# Altium footprint library Miscellaneous Connectors.PcbLib: 249 footprints (part 16 of 16)
Each footprint in its own frame and in the unit in brackets; x right, y up, seen from the top. Pads: shape width x height; smd on the part's side, far side on the other; paste and mask are expansions set on the pad; w line width, h text height; cw(c..) or ccw(c..) is an arc to the next point about the centre after c.
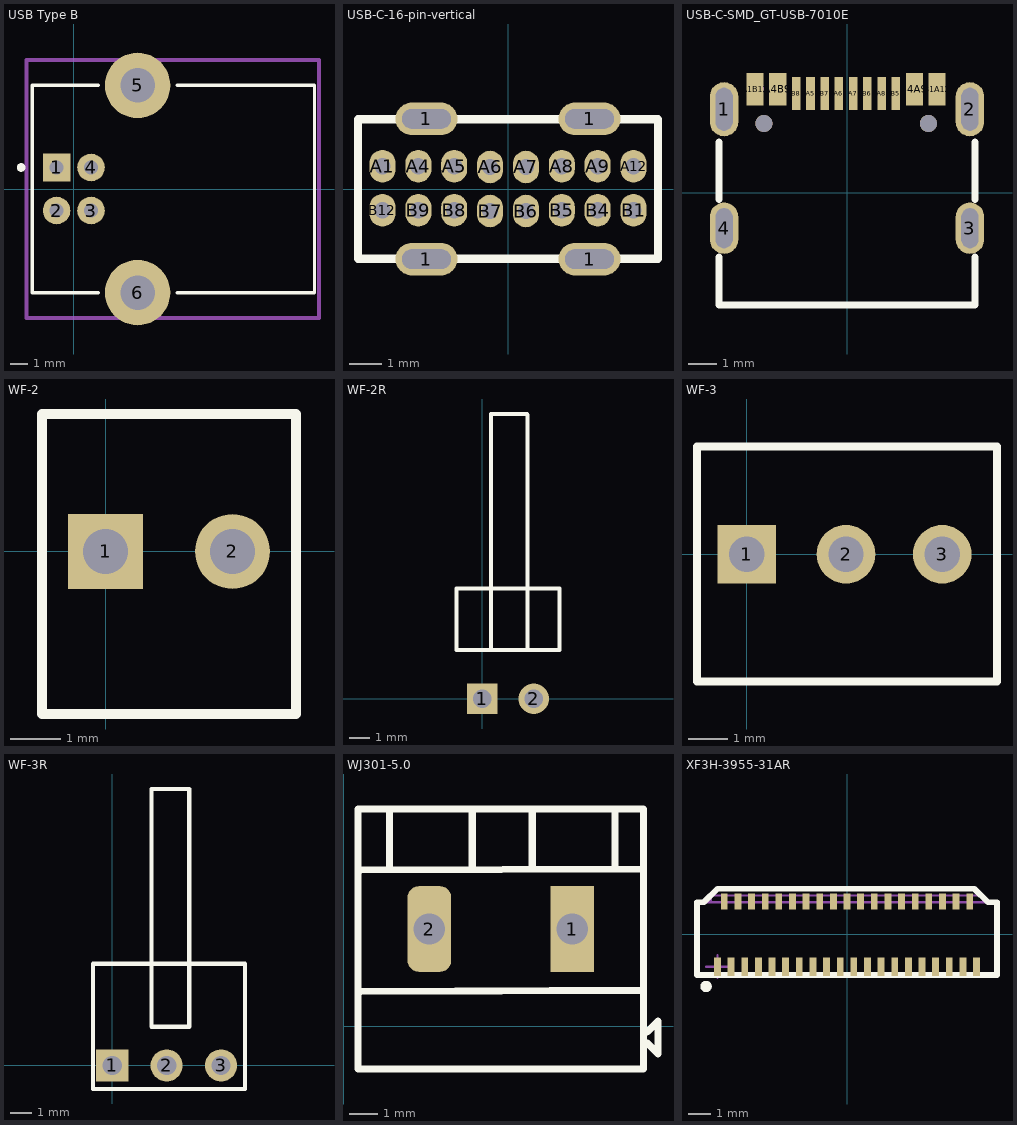
[diagram p15: the footprints below, top view; thin cyan lines are the x and y axes]

## USB Type B [mm] "Connector; USB1.1, Type B, Thru-Hole; 4 Position; Right Angle"
height 11.1
pads (6):
  rect 1.6x1.6 hole 0.8: 1(-1,1.25)
  round 1.6 hole 0.8: 2(-1,-1.25) 3(1,-1.25) 4(1,1.25)
  round 3.8 hole 2: 5(3.71,6.02) 6(3.71,-6.02)
Top Overlay:
  circle w0.25: c-3.06,1.25 r0.125
  lines w0.2: 1.41,-6.02 -2.41,-6.02 -2.41,6.02 1.41,6.02 ; 6.01,-6.02 13.99,-6.02 13.99,6.02 6.01,6.02
Mechanical 15:
  lines w0.254: -2.75,-7.5 -2.75,7.5 14.25,7.5 14.25,-7.5 -2.75,-7.5
3D body "User Library-Samtec - USB-B-S-X-W-TH.STEP": height 11, standoff -3.64, extent -2.55,-7.4 13.95,7.398

## USB-C-16-pin-vertical [mm]
pads (20):
  oval 1.9x1 hole 0.6 slot 1.5 at 0 deg paste+0 mask+0.05: 1(-2.5,-2.15) 1(-2.5,2.15) 1(2.5,-2.15) 1(2.5,2.15)
  oval 0.8x1 hole 0.5: A1(-3.85,0.7) A4(-2.75,0.7) A5(-1.65,0.7) A6(-0.55,0.675) A7(0.55,0.675) A8(1.65,0.7) A9(2.75,0.7) A12(3.85,0.7) B1(3.85,-0.65) B4(2.75,-0.65) B5(1.65,-0.65) B6(0.55,-0.675) B7(-0.55,-0.675) B8(-1.65,-0.65) B9(-2.75,-0.65) B12(-3.85,-0.65)
Top Overlay:
  lines w0.254: 4.6,2.1 4.6,-2.139 -4.6,-2.139 -4.6,2.139 4.6,2.139
3D body "XB-USB-C-1403.stp": height 10, standoff -2.12, extent -4.584,-2.231 4.762,2.371

## USB-C-SMD_GT-USB-7010E [mm]
pads (18):
  oval 1x1.9 hole 0.6 slot 1.5 at 90 deg paste+0 mask+0.05: 1(-4.32,2.941) 2(4.32,2.941)
  oval 1x1.8 hole 0.6 slot 1.4 at 90 deg paste+0 mask+0.05: 3(4.32,-1.239) 4(-4.32,-1.239)
  rect 0.6x1.15 smd paste-100 mask+0.05: A1B12(-3.232,3.641) A4B9(-2.432,3.641) B1A12(3.168,3.641) B4A9(2.368,3.641)
  rect 0.3x1.15 smd paste-100 mask+0.05: A5(-1.282,3.491) A6(-0.282,3.491) A7(0.218,3.491) A8(1.218,3.491) B5(1.718,3.491) B6(0.718,3.491) B7(-0.782,3.491) B8(-1.782,3.491)
  round 0.6 hole 0.6 unplated paste+0: ""(-2.922,2.441) ""(2.858,2.441)
Top Overlay:
  lines w0.254: -4.5,-2.248 -4.5,-3.939 4.5,-3.939 4.5,-2.248 ; -4.5,-0.23 -4.5,1.782 ; 4.5,-0.23 4.5,1.782
Top Paste:
  drawing of 16 lines, arcs and shapes, not listed
Mechanical 15:
  circle w0.254: c-3.175,3.666 r0.127
  circle w0.254: c-2.922,2.441 r0.125
  circle w0.254: c2.858,2.441 r0.125
3D body "2671767.stp": height 3.36, standoff -1, extent -4.47,-3.9 4.47,3.7

## WF-2 [mm] "Connector; Header; 2 Position"
pads (2):
  rect 1.5x1.5 hole 0.9: 1(0,0)
  round 1.5 hole 0.9: 2(2.54,0)
Top Overlay:
  lines w0.2: -1.27,-3.25 -1.27,2.75 3.81,2.75 3.81,-3.25 -1.27,-3.25
3D body "User Library-WF-2.STEP": height 11.73, standoff -2.55, extent -1.35,-3.25 3.85,2.65

## WF-2R [mm] "Connector; Header; 2 Position"
pads (2):
  rect 1.5x1.5 hole 0.9: 1(0,0)
  round 1.5 hole 0.9: 2(2.54,0)
Top Overlay:
  lines w0.2: -1.27,5.4 -1.27,2.4 3.81,2.4 3.81,5.4 ; -1.27,5.45 3.81,5.45 ; 0.43,2.5 0.43,14 ; 0.43,14.05 2.2,14.05 ; 2.23,2.4 2.23,14
3D body "User Library-WF-2R.step": height 5.8, standoff -3.4, extent -1.18,-0.3 3.9,12.9

## WF-3 [mm] "Connector; Header 2.54; 3 Position"
pads (3):
  rect 1.5x1.5 hole 0.9: 1(0,0)
  round 1.5 hole 0.9: 2(2.54,0) 3(5,0)
Top Overlay:
  lines w0.2: -1.27,-3.25 -1.27,2.75 6.4,2.75 6.4,-3.25 -1.27,-3.25
3D body "User Library-WF-3.step": height 11.73, standoff -3, extent -1.36,-3.2 6.44,2.7

## WF-3R [mm] "Connector; Header; 3 Position"
pads (3):
  rect 1.5x1.5 hole 0.9: 1(0,0)
  round 1.5 hole 0.9: 2(2.54,0) 3(5.08,0)
Top Overlay:
  lines w0.2: -0.9,-1.1 -0.9,4.75 6.2,4.75 6.2,-1.1 -0.9,-1.1 ; 1.83,1.8 1.83,12.9 3.6,12.9 3.6,1.8 1.83,1.8
3D body "User Library-WF-2R.step": height 5.8, standoff -3.4, extent 0.12,-0.3 5.2,12.9

## WJ301-5.0 [mm] "Terminal Block 2pin, pitch 5mm"
height 8.4
pads (2):
  rect 1.524x3 hole 1.1: 1(8,3.4)
  rrect50% 1.524x3 hole 1.1: 2(3,3.4)
Top Overlay:
  lines w0.254: 0.6,1.209 10.5,1.257 ; 0.6,5.463 10.5,5.5 ; 1.6,5.5 1.6,7.5 ; 4.5,5.5 4.5,7.5 ; 6.6,5.5 6.6,7.5 ; 9.5,5.5 9.5,7.5 ; 10.627,-0.205 11.008,0.176 11.008,-0.967 10.64,-0.599 ; 0.5,-1.5 10.5,-1.5 10.5,7.6 0.5,7.6 0.5,-1.5
3D body "User Library-DG300-5_0-02P-12.STEP": height 12.6, standoff -4.4, extent 0.5,-1.6 10.5,7.4

## XF3H-3955-31AR [mm] "Connector; FPC/FFC, SM, 50 Position, Right Angle, Pitch 0.3mm"
height 2
pads (39):
  rect 0.3x0.8 smd: 1(-5.7,-1.432) 3(-5.1,-1.432) 5(-4.5,-1.432) 7(-3.9,-1.432) 9(-3.3,-1.432) 11(-2.7,-1.432) 13(-2.1,-1.432) 15(-1.5,-1.432) 17(-0.9,-1.432) 19(-0.3,-1.432) 21(0.3,-1.432) 23(0.9,-1.432) 25(1.5,-1.432) 27(2.1,-1.432) 29(2.7,-1.432) 31(3.3,-1.432) 33(3.9,-1.432) 35(4.5,-1.432) 37(5.1,-1.432) 39(5.7,-1.432)
  rect 0.3x0.7 smd: 2(-5.4,1.433) 4(-4.8,1.433) 6(-4.2,1.433) 8(-3.6,1.433) 10(-3,1.433) 12(-2.4,1.433) 14(-1.8,1.433) 16(-1.2,1.433) 18(-0.6,1.433) 20(0,1.433) 22(0.6,1.433) 24(1.2,1.433) 26(1.8,1.433) 28(2.4,1.433) 30(3,1.433) 32(3.6,1.433) 34(4.2,1.433) 36(4.8,1.433) 38(5.4,1.433)
Top Overlay:
  circle w0.25: c-6.2,-2.3 r0.125
  lines w0.254: -6.6,-1.8 6.6,-1.8 6.6,1.4 6.2,1.4 5.6,2 -5.7,2 -6.3,1.4 -6.6,1.4 -6.6,-1.8
Mechanical 13:
  lines w0.1: -6,1.4 -6,1.7 6,1.7 6,1.4 ; -6.6,-1.75 6.6,-1.75 6.6,1.4 -6.6,1.4 -6.6,-1.75
Mechanical 15:
  lines w0.1: -6.2,-1.432 -5.2,-1.432 ; -5.7,-1.932 -5.7,-0.932